# Altium integrated library Cap-Cer-SMD_V2.IntLib: 957 symbols (part 4 of 7) (continued)
## 22pF_0805N_50V_5%_C0G/NP0-DNF
designator C?, comment value (22pF)  Voltage: 50V  Text1: 0805  (hidden comment: 22pF_C0805_50V_5%_C0G/NP0)
Cap Ceramic C0G/NP0 - Do not Fit; Manufacturer: Various; Part Number: DNF - 22pF 0805 50V 5% C0G/NP0; Tol: 5%; Package: CAPC0805X110N; EDM-PN: *; Text2: *; SAAB PN: *; DCE Part No: *
footprint CAPC0805X110N (Chip Capacitor, 0805, 2-Leads, Body 2.0x1.3mm, IPC Medium Density)
pins: 1, 2

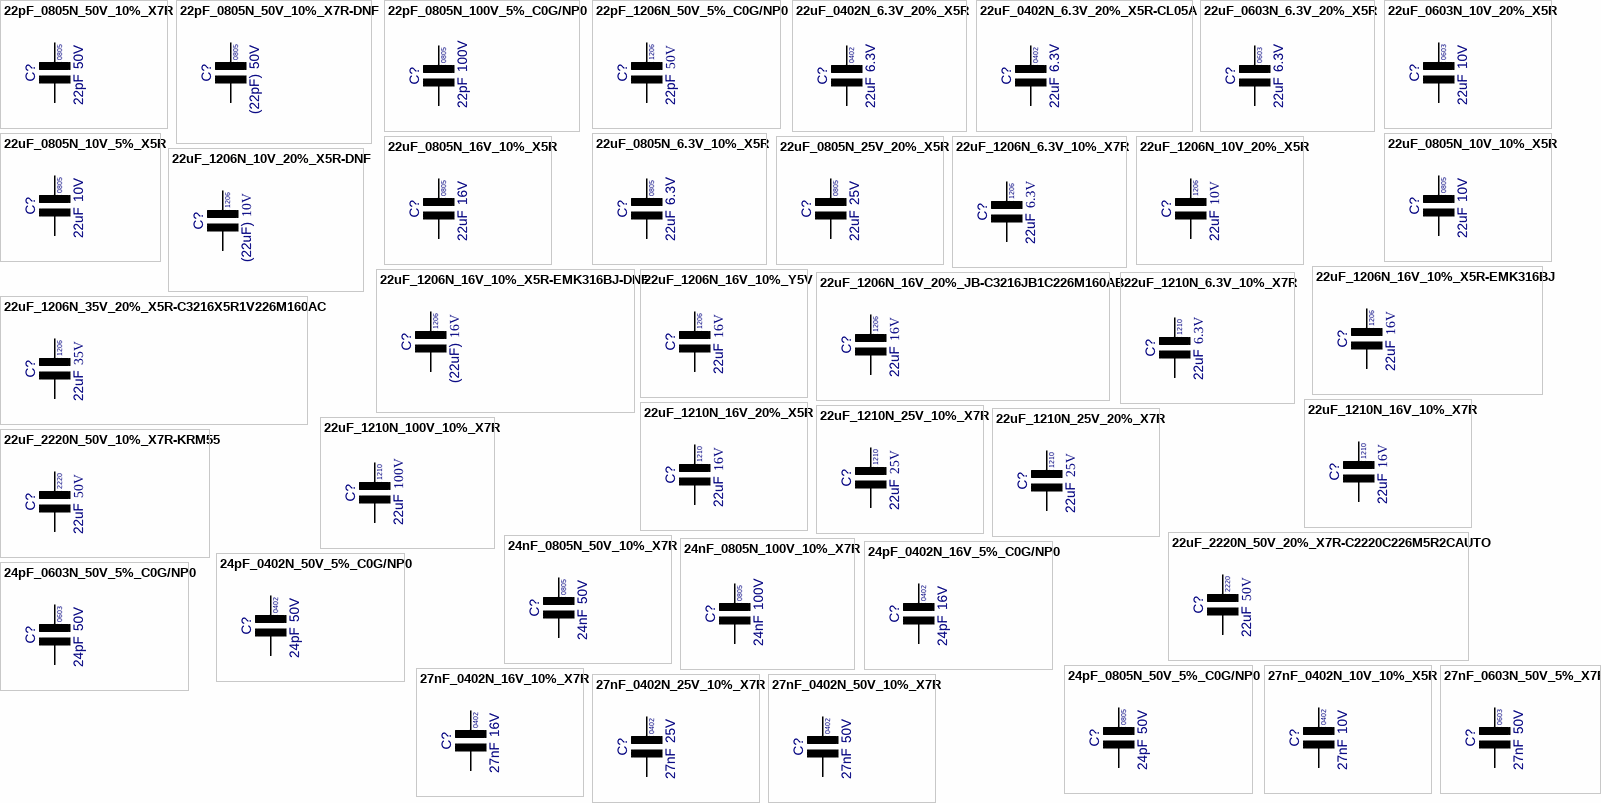
[diagram p13: symbols 22pF_0805N_50V_10%_X7R to 27nF_0603N_50V_5%_X7R]

## 22pF_0805N_50V_10%_X7R
designator C?, comment value 22pF  Voltage: 50V  Text1: 0805  (hidden comment: 22pF_C0805_50V_10%_X7R)
Cap Ceramic X7R; Manufacturer: Various; Part Number: 22pF 0805 50V 10% X7R; EDM-PN: CAP406; Tol: 10%; Package: CAPC0805X110N; Text2: *; SAAB PN: *; DCE Part No: *
footprint CAPC0805X110N (Chip Capacitor, 0805, 2-Leads, Body 2.0x1.3mm, IPC Medium Density)
pins: 1, 2

## 22pF_0805N_50V_10%_X7R-DNF
designator C?, comment value (22pF)  Voltage: 50V  Text1: 0805  (hidden comment: 22pF_C0805_50V_10%_X7R-DNF)
Cap Ceramic X7R - Do not Fit; Manufacturer: Various; Part Number: DNF - 22pF 0805 50V 10% X7R; EDM-PN: CAP406; Tol: 10%; Package: CAPC0805X110N; Text2: *; SAAB PN: *; DCE Part No: *
footprint CAPC0805X110N (Chip Capacitor, 0805, 2-Leads, Body 2.0x1.3mm, IPC Medium Density)
pins: 1, 2

## 22pF_0805N_100V_5%_C0G/NP0
designator C?, comment value 22pF  Voltage: 100V  Text1: 0805  (hidden comment: 22pF_C0805_100V_5%_C0G/NP0)
Cap Ceramic C0G/NP0; Manufacturer: Various; Part Number: 22pF 0805 100V 5% C0G/NP0; Tol: 5%; Package: CAPC0805X110N; EDM-PN: *; Text2: *; SAAB PN: *; DCE Part No: *
footprint CAPC0805X110N (Chip Capacitor, 0805, 2-Leads, Body 2.0x1.3mm, IPC Medium Density)
pins: 1, 2

## 22pF_1206N_50V_5%_C0G/NP0
designator C?, comment value 22pF  Voltage: 50V  Text1: 1206  (hidden comment: 22pF_C1206_50V_5%_C0G/NP0)
Cap Ceramic C0G/NP0; Manufacturer: Various; Part Number: 22pF 1206 50V 5% C0G/NP0; Tol: 5%; Package: CAPC1206X135N; EDM-PN: *; Text2: *; SAAB PN: *; DCE Part No: *
footprint CAPC1206X135N (Chip Capacitor, 1206, 2-Leads, Body 3.2x1.6mm, IPC Medium Density)
pins: 1, 2

## 22uF_0402N_6.3V_20%_X5R
designator C?, comment value 22uF  Voltage: 6.3V  Text1: 0402  (hidden comment: 224F_C0402_6.3V_20%_X5R)
Cap Ceramic X5R; Manufacturer: Various; Part Number: 22uF 0402 6.3V 20% X5R; EDM-PN: CAP948; Tol: 20%; Package: CAPC0402X60N; Text2: *; SAAB PN: *; DCE Part No: *
footprint CAPC0402X60N (Chip Capacitor, 0402, 2-Leads, Body 1.0x0.5mm, IPC Medium Density)
pins: 1, 2

## 22uF_0402N_6.3V_20%_X5R-CL05A
designator C?, comment value 22uF  Voltage: 6.3V  Text1: 0402  (hidden comment: 224F_C0402_6.3V_20%_X5R)
Cap Ceramic X5R; Manufacturer: Samsung; Part Number: CL05A226MQ5QUNC; Tol: 20%; Package: CAPC0402X60N; EDM-PN: *; Text2: *; SAAB PN: *; DCE Part No: *
footprint CAPC0402X60N (Chip Capacitor, 0402, 2-Leads, Body 1.0x0.5mm, IPC Medium Density)
pins: 1, 2

## 22uF_0603N_6.3V_20%_X5R
designator C?, comment value 22uF  Voltage: 6.3V  Text1: 0603  (hidden comment: 22uF_C0603_6.3V_20%_X5R)
Cap Ceramic X5R; Manufacturer: Various; Part Number: 22uF 0603 6.3V 20% X5R; DCE Part No: 9645; Tol: 20%; Package: CAPC0603X85N; EDM-PN: *; Text2: *; SAAB PN: *
footprint CAPC0603X85N (Chip Capacitor, 0603, 2-Leads, Body 1.6x0.8mm, IPC Medium Density)
pins: 1, 2

## 22uF_0603N_10V_20%_X5R
designator C?, comment value 22uF  Voltage: 10V  Text1: 0603  (hidden comment: 22uF_C0603_10V_20%_X5R)
Cap Ceramic X5R; Manufacturer: Various; Part Number: 22uF 0603 10V 20% X5R; EDM-PN: CAP933; Tol: 20%; Package: CAPC0603X85N; Text2: *; SAAB PN: *; DCE Part No: *
footprint CAPC0603X85N (Chip Capacitor, 0603, 2-Leads, Body 1.6x0.8mm, IPC Medium Density)
pins: 1, 2

## 22uF_0805N_6.3V_10%_X5R
designator C?, comment value 22uF  Voltage: 6.3V  Text1: 0805  (hidden comment: 22uF_C0805_6.3V_10%_X5R)
Cap Ceramic X5R; Manufacturer: Various; Part Number: 22uF 0805 6.3V 10% X5R; EDM-PN: CAP455; Tol: 10%; Package: CAPC0805X110N; Text2: *; SAAB PN: *; DCE Part No: *
footprint CAPC0805X110N (Chip Capacitor, 0805, 2-Leads, Body 2.0x1.3mm, IPC Medium Density)
pins: 1, 2

## 22uF_0805N_10V_5%_X5R
designator C?, comment value 22uF  Voltage: 10V  Text1: 0805  (hidden comment: 22uF_C0805_10V_5%_X5R)
Cap Ceramic X5R; Manufacturer: Various; Part Number: 22uF 0805 10V 5% X5R; EDM-PN: CAP455; Tol: 5%; Package: CAPC0805X110N; Text2: *; SAAB PN: *; DCE Part No: *
footprint CAPC0805X110N (Chip Capacitor, 0805, 2-Leads, Body 2.0x1.3mm, IPC Medium Density)
pins: 1, 2

## 22uF_0805N_10V_10%_X5R
designator C?, comment value 22uF  Voltage: 10V  Text1: 0805  (hidden comment: 22uF_C0805_10V_10%_X5R)
Cap Ceramic X5R; Manufacturer: Various; Part Number: 22uF 0805 10V 10% X5R; Tol: 10%; Package: CAPC0805X110N; EDM-PN: *; Text2: *; SAAB PN: *; DCE Part No: *
footprint CAPC0805X110N (Chip Capacitor, 0805, 2-Leads, Body 2.0x1.3mm, IPC Medium Density)
pins: 1, 2

## 22uF_0805N_16V_10%_X5R
designator C?, comment value 22uF  Voltage: 16V  Text1: 0805  (hidden comment: 22uF_C0805_16V_10%_X5R)
Cap Ceramic X5R; Manufacturer: Various; Part Number: 22uF 0805 16V 10% X5R; Tol: 10%; Package: CAPC0805X110N; EDM-PN: *; Text2: *; SAAB PN: *; DCE Part No: *
footprint CAPC0805X110N (Chip Capacitor, 0805, 2-Leads, Body 2.0x1.3mm, IPC Medium Density)
pins: 1, 2

## 22uF_0805N_25V_20%_X5R
designator C?, comment value 22uF  Voltage: 25V  Text1: 0805  (hidden comment: 22uF_C0805_25V_20%_X5R)
Cap Ceramic X5R; Manufacturer: Various; Part Number: 22uF 0805 25V 20% X5R; Tol: 20%; Package: CAPC0805X110N; EDM-PN: *; Text2: *; SAAB PN: *; DCE Part No: *
footprint CAPC0805X110N (Chip Capacitor, 0805, 2-Leads, Body 2.0x1.3mm, IPC Medium Density)
pins: 1, 2

## 22uF_1206N_6.3V_10%_X7R
designator C?, comment value 22uF  Voltage: 6.3V  Text1: 1206  (hidden comment: 22uF_C1206_6.3V_10%_X7R)
Cap Ceramic X7R; Manufacturer: Various; Part Number: 22uF 1206 6.3V 10% X7R; Tol: 10%; Package: CAPC1206X135N; EDM-PN: *; Text2: *; SAAB PN: *; DCE Part No: *
footprint CAPC1206X135N (Chip Capacitor, 1206, 2-Leads, Body 3.2x1.6mm, IPC Medium Density)
pins: 1, 2

## 22uF_1206N_10V_20%_X5R
designator C?, comment value 22uF  Voltage: 10V  Text1: 1206  (hidden comment: 22uF_C1206_10V_20%_X5R)
Cap Ceramic X5R; Manufacturer: Various; Part Number: 22uF 1206 10V 20% X5R; EDM-PN: CAP424; Tol: 20%; Package: CAPC1206X135N; Text2: *; SAAB PN: *; DCE Part No: *
footprint CAPC1206X135N (Chip Capacitor, 1206, 2-Leads, Body 3.2x1.6mm, IPC Medium Density)
pins: 1, 2

## 22uF_1206N_10V_20%_X5R-DNF
designator C?, comment value (22uF)  Voltage: 10V  Text1: 1206  (hidden comment: 22uF_C1206_10V_20%_X5R)
Cap Ceramic X5R - Do not Fit; Manufacturer: Various; Part Number: DNF - 22uF 1206 10V 20% X5R; EDM-PN: CAP424; Tol: 20%; Package: CAPC1206X135N; Text2: *; SAAB PN: *; DCE Part No: *
footprint CAPC1206X135N (Chip Capacitor, 1206, 2-Leads, Body 3.2x1.6mm, IPC Medium Density)
pins: 1, 2

## 22uF_1206N_16V_10%_X5R-EMK316BJ
designator C?, comment value 22uF  Voltage: 16V  Text1: 1206  (hidden comment: 22uF_C1206_16V_10%_X5R)
Cap Ceramic X5R; Manufacturer: Taiyo Yuden; Part Number: EMK316BJ226KL; EDM-PN: CAP735; Tol: 10%; Package: CAPC1206X135N; Text2: *; SAAB PN: *; DCE Part No: *
footprint CAPC1206X178N (Chip Capacitor, 1206, 2-Leads, Body 3.2x1.6mm, IPC Medium Density)
pins: 1, 2

## 22uF_1206N_16V_10%_X5R-EMK316BJ-DNF
designator C?, comment value (22uF)  Voltage: 16V  Text1: 1206  (hidden comment: 22uF_C1206_16V_10%_X5R-DNF)
Cap Ceramic X5R - Do not Fit; Manufacturer: Taiyo Yuden; Part Number: DNF-EMK316BJ226KL; EDM-PN: NA; Tol: 10%; Package: CAPC1206X135N; Text2: *; SAAB PN: *; DCE Part No: *
footprint CAPC1206X178N (Chip Capacitor, 1206, 2-Leads, Body 3.2x1.6mm, IPC Medium Density)
pins: 1, 2

## 22uF_1206N_16V_10%_Y5V
designator C?, comment value 22uF  Voltage: 16V  Text1: 1206  (hidden comment: 22uF_C1206_16V_10%_Y5V)
Cap Ceramic Y5V; Manufacturer: Various; Part Number: 22uF 1206 16V 10% Y5V; Tol: 10%; Package: CAPC1206X135N; EDM-PN: *; Text2: *; SAAB PN: *; DCE Part No: *
footprint CAPC1206X135N (Chip Capacitor, 1206, 2-Leads, Body 3.2x1.6mm, IPC Medium Density)
pins: 1, 2

## 22uF_1206N_16V_20%_JB-C3216JB1C226M160AB
designator C?, comment value 22uF  Voltage: 16V  Text1: 1206  (hidden comment: C3216JB1C226M160AB)
Cap Ceramic JB - Low ESL; Manufacturer: TDK; Tol: 20%; Part Number: C3216JB1C226M160AB; Package: CAPC1206X135N; EDM-PN: *; Text2: *; SAAB PN: *; DCE Part No: *
footprint CAPC1206X178N (Chip Capacitor, 1206, 2-Leads, Body 3.2x1.6mm, IPC Medium Density)
pins: 1, 2

## 22uF_1206N_35V_20%_X5R-C3216X5R1V226M160AC
designator C?, comment value 22uF  Voltage: 35V  Text1: 1206  (hidden comment: C3216X5R1V226M160AC)
Cap Ceramic X5R; Manufacturer: TDK; Tol: 20%; Part Number: C3216X5R1V226M160AC; Package: CAPC1206X135N; EDM-PN: *; Text2: *; SAAB PN: *; DCE Part No: *
footprint CAPC1206X178N (Chip Capacitor, 1206, 2-Leads, Body 3.2x1.6mm, IPC Medium Density)
pins: 1, 2

## 22uF_1210N_6.3V_10%_X7R
designator C?, comment value 22uF  Voltage: 6.3V  Text1: 1210  (hidden comment: 22uF_C1210_6.3V_10%_X7R)
Cap Ceramic X5R; Manufacturer: Various; Part Number: 22uF 1210 6.3V 10% X7R; Tol: 10%; Package: CAPC1210X135N; EDM-PN: *; Text2: *; SAAB PN: *; DCE Part No: *
footprint CAPC1210X135N (Chip Capacitor, 1210, 2-Leads, Body 3.2x2.5mm, IPC Medium Density)
pins: 1, 2

## 22uF_1210N_16V_10%_X7R
designator C?, comment value 22uF  Voltage: 16V  Text1: 1210  (hidden comment: 22uF_C1210_16V_10%_X7R)
Cap Ceramic X7R; Manufacturer: Various; Part Number: 22uF 1210 16V 10% X7R; Tol: 10%; Package: CAPC1210X135N; EDM-PN: *; Text2: *; SAAB PN: *; DCE Part No: *
footprint CAPC1210X135N (Chip Capacitor, 1210, 2-Leads, Body 3.2x2.5mm, IPC Medium Density)
pins: 1, 2

## 22uF_1210N_16V_20%_X5R
designator C?, comment value 22uF  Voltage: 16V  Text1: 1210  (hidden comment: 22uF_C1210_16V_20%_X5R)
Cap Ceramic X5R; Manufacturer: Various; Part Number: 22uF 1210 16V 20% X5R; Tol: 20%; Package: CAPC1210X135N; EDM-PN: *; Text2: *; SAAB PN: *; DCE Part No: *
footprint CAPC1210X135N (Chip Capacitor, 1210, 2-Leads, Body 3.2x2.5mm, IPC Medium Density)
pins: 1, 2

## 22uF_1210N_25V_10%_X7R
designator C?, comment value 22uF  Voltage: 25V  Text1: 1210  (hidden comment: 22uF_C1210_25V_10%_X7R)
Cap Ceramic X7R; Manufacturer: Various; Part Number: 22uF 1210 25V 10% X7R; EDM-PN: CAP995; Tol: 10%; SAAB PN: 1AAB00437AEA; Package: CAPC1210X135N; Text2: *; DCE Part No: *
footprint CAPC1210X135N (Chip Capacitor, 1210, 2-Leads, Body 3.2x2.5mm, IPC Medium Density)
pins: 1, 2

## 22uF_1210N_25V_20%_X7R
designator C?, comment value 22uF  Voltage: 25V  Text1: 1210  (hidden comment: 22uF_C1210_25V_20%_X7R)
Cap Ceramic X7R; Manufacturer: Various; Part Number: 22uF 1210 25V 20% X7R; EDM-PN: CAP871; Tol: 20%; Reutech PN: 5910-CA-0490; SAAB PN: 1AAB00485AEA; Package: CAPC1210X135N; Text2: *; DCE Part No: *
footprint CAPC1210X135N (Chip Capacitor, 1210, 2-Leads, Body 3.2x2.5mm, IPC Medium Density)
pins: 1, 2

## 22uF_1210N_100V_10%_X7R
designator C?, comment value 22uF  Voltage: 100V  Text1: 1210  (hidden comment: 22uF_C1210_100V_10%_X7R)
Cap Ceramic X7R; Manufacturer: Various; Part Number: 22uF 1210 100V 10% X7R; Tol: 10%; Package: CAPC1210X135N; EDM-PN: *; Text2: *; SAAB PN: *; DCE Part No: *
footprint CAPC1210X135N (Chip Capacitor, 1210, 2-Leads, Body 3.2x2.5mm, IPC Medium Density)
pins: 1, 2

## 22uF_2220N_50V_10%_X7R-KRM55
designator C?, comment value 22uF  Voltage: 50V  Text1: 2220  (hidden comment: 22uF_C2220_50V_10%_X7R)
Cap Ceramic X7R Stacked; Manufacturer: Murata; Part Number: KRM55TR71H226MH01L; Tol: 10%; Reutech PN: 5910-CA-0553; Package: CAPC2220-2Chip-5.5; EDM-PN: *; Text2: *; SAAB PN: *; DCE Part No: *
footprint CAPC2220-2Chip-5.5 (Chip Capacitor, 2220, 2-Chips, 6.1x5.3mm)
pins: 1, 2

## 22uF_2220N_50V_20%_X7R-C2220C226M5R2CAUTO
designator C?, comment value 22uF  Voltage: 50V  Text1: 2220  (hidden comment: C2220C226M5R2CAUTO)
Cap Ceramic X7R Stacked AEC-Q200; Manufacturer: Kemet; Tol: 20%; Reutech PN: 5910-CE-0158; Part Number: C2220C226M5R2CAUTO; Package: CAPC2220-2Chip-5.5; EDM-PN: *; Text2: *; SAAB PN: *; DCE Part No: *
footprint CAPC2220-2Chip-5.5 (Chip Capacitor, 2220, 2-Chips, 6.1x5.3mm)
pins: 1, 2

## 24nF_0805N_50V_10%_X7R
designator C?, comment value 24nF  Voltage: 50V  Text1: 0805  (hidden comment: 24nF_C0805_50V_10%_X7R)
Cap Ceramic X7R; Manufacturer: Various; Part Number: 24nF 0805 50V 10% X7R; Tol: 10%; Package: CAPC0805X110N; EDM-PN: *; Text2: *; SAAB PN: *; DCE Part No: *
footprint CAPC0805X110N (Chip Capacitor, 0805, 2-Leads, Body 2.0x1.3mm, IPC Medium Density)
pins: 1, 2

## 24nF_0805N_100V_10%_X7R
designator C?, comment value 24nF  Voltage: 100V  Text1: 0805  (hidden comment: 24nF_C0805_100V_10%_X7R)
Cap Ceramic X7R; Manufacturer: Various; Part Number: 24nF 0805 100V 10% X7R; Tol: 10%; Package: CAPC0805X110N; EDM-PN: *; Text2: *; SAAB PN: *; DCE Part No: *
footprint CAPC0805X110N (Chip Capacitor, 0805, 2-Leads, Body 2.0x1.3mm, IPC Medium Density)
pins: 1, 2

## 24pF_0402N_16V_5%_C0G/NP0
designator C?, comment value 24pF  Voltage: 16V  Text1: 0402  (hidden comment: 24pF_C0402_16V_5%_C0G/NP0)
Cap Ceramic C0G/NP0; Manufacturer: Various; Part Number: 24pF 0402 16V 5% C0G/NP0; Tol: 5%; Package: CAPC0402X60N; EDM-PN: *; Text2: *; SAAB PN: *; DCE Part No: *
footprint CAPC0402X60N (Chip Capacitor, 0402, 2-Leads, Body 1.0x0.5mm, IPC Medium Density)
pins: 1, 2

## 24pF_0402N_50V_5%_C0G/NP0
designator C?, comment value 24pF  Voltage: 50V  Text1: 0402  (hidden comment: 24pF_C0402_50V_5%_C0G/NP0)
Cap Ceramic C0G/NP0; Manufacturer: Various; Part Number: 24pF 0402 50V 5% C0G/NP0; Tol: 5%; Package: CAPC0402X60N; EDM-PN: *; Text2: *; SAAB PN: *; DCE Part No: *
footprint CAPC0402X60N (Chip Capacitor, 0402, 2-Leads, Body 1.0x0.5mm, IPC Medium Density)
pins: 1, 2

## 24pF_0603N_50V_5%_C0G/NP0
designator C?, comment value 24pF  Voltage: 50V  Text1: 0603  (hidden comment: 24pF_C0603_50V_5%_C0G/NP0)
Cap Ceramic C0G/NP0; Manufacturer: Various; Part Number: 24pF 0603 50V 5% C0G/NP0; Tol: 5%; Package: CAPC0603X85N; EDM-PN: *; Text2: *; SAAB PN: *; DCE Part No: *
footprint CAPC0603X85N (Chip Capacitor, 0603, 2-Leads, Body 1.6x0.8mm, IPC Medium Density)
pins: 1, 2

## 24pF_0805N_50V_5%_C0G/NP0
designator C?, comment value 24pF  Voltage: 50V  Text1: 0805  (hidden comment: 24pF_C0805_50V_5%_C0G/NP0)
Cap Ceramic C0G/NP0; Manufacturer: Various; Part Number: 24pF 0805 50V 5% C0G/NP0; Tol: 5%; Package: CAPC0805X110N; EDM-PN: *; Text2: *; SAAB PN: *; DCE Part No: *
footprint CAPC0805X110N (Chip Capacitor, 0805, 2-Leads, Body 2.0x1.3mm, IPC Medium Density)
pins: 1, 2

## 27nF_0402N_10V_10%_X5R
designator C?, comment value 27nF  Voltage: 10V  Text1: 0402  (hidden comment: 27nF_C0402_10V_10%_X5R)
Cap Ceramic X5R; Manufacturer: Various; Part Number: 27nF 0402 10V 10% X5R; Tol: 10%; Reutech PN: 5910-CA-0460; Package: CAPC0402X60N; EDM-PN: *; Text2: *; SAAB PN: *; DCE Part No: *
footprint CAPC0402X60N (Chip Capacitor, 0402, 2-Leads, Body 1.0x0.5mm, IPC Medium Density)
pins: 1, 2

## 27nF_0402N_16V_10%_X7R
designator C?, comment value 27nF  Voltage: 16V  Text1: 0402  (hidden comment: 27nF_C0402_16V_10%_X7R)
Cap Ceramic X7R; Manufacturer: Various; Part Number: 27nF 0402 16V 10% X7R; Tol: 10%; Package: CAPC0402X60N; EDM-PN: *; Text2: *; SAAB PN: *; DCE Part No: *
footprint CAPC0402X60N (Chip Capacitor, 0402, 2-Leads, Body 1.0x0.5mm, IPC Medium Density)
pins: 1, 2

## 27nF_0402N_25V_10%_X7R
designator C?, comment value 27nF  Voltage: 25V  Text1: 0402  (hidden comment: 27nF_C0402_25V_10%_X7R)
Cap Ceramic X7R; Manufacturer: Various; Part Number: 27nF 0402 25V 10% X7R; Tol: 10%; Package: CAPC0402X60N; EDM-PN: *; Text2: *; SAAB PN: *; DCE Part No: *
footprint CAPC0402X60N (Chip Capacitor, 0402, 2-Leads, Body 1.0x0.5mm, IPC Medium Density)
pins: 1, 2

## 27nF_0402N_50V_10%_X7R
designator C?, comment value 27nF  Voltage: 50V  Text1: 0402  (hidden comment: 27nF_C0402_50V_10%_X7R)
Cap Ceramic X7R; Manufacturer: Various; Part Number: 27nF 0402 50V 10% X7R; Tol: 10%; Package: CAPC0402X60N; EDM-PN: *; Text2: *; SAAB PN: *; DCE Part No: *
footprint CAPC0402X60N (Chip Capacitor, 0402, 2-Leads, Body 1.0x0.5mm, IPC Medium Density)
pins: 1, 2

## 27nF_0603N_50V_5%_X7R
designator C?, comment value 27nF  Voltage: 50V  Text1: 0603  (hidden comment: 27nF_C0603_50V_5%_X7R)
Cap Ceramic X7R; Manufacturer: Various; Part Number: 27nF 0603 50V 5% X7R; EDM-PN: CAP654; Tol: 5%; Package: CAPC0603X85N; Text2: *; SAAB PN: *; DCE Part No: *
footprint CAPC0603X85N (Chip Capacitor, 0603, 2-Leads, Body 1.6x0.8mm, IPC Medium Density)
pins: 1, 2

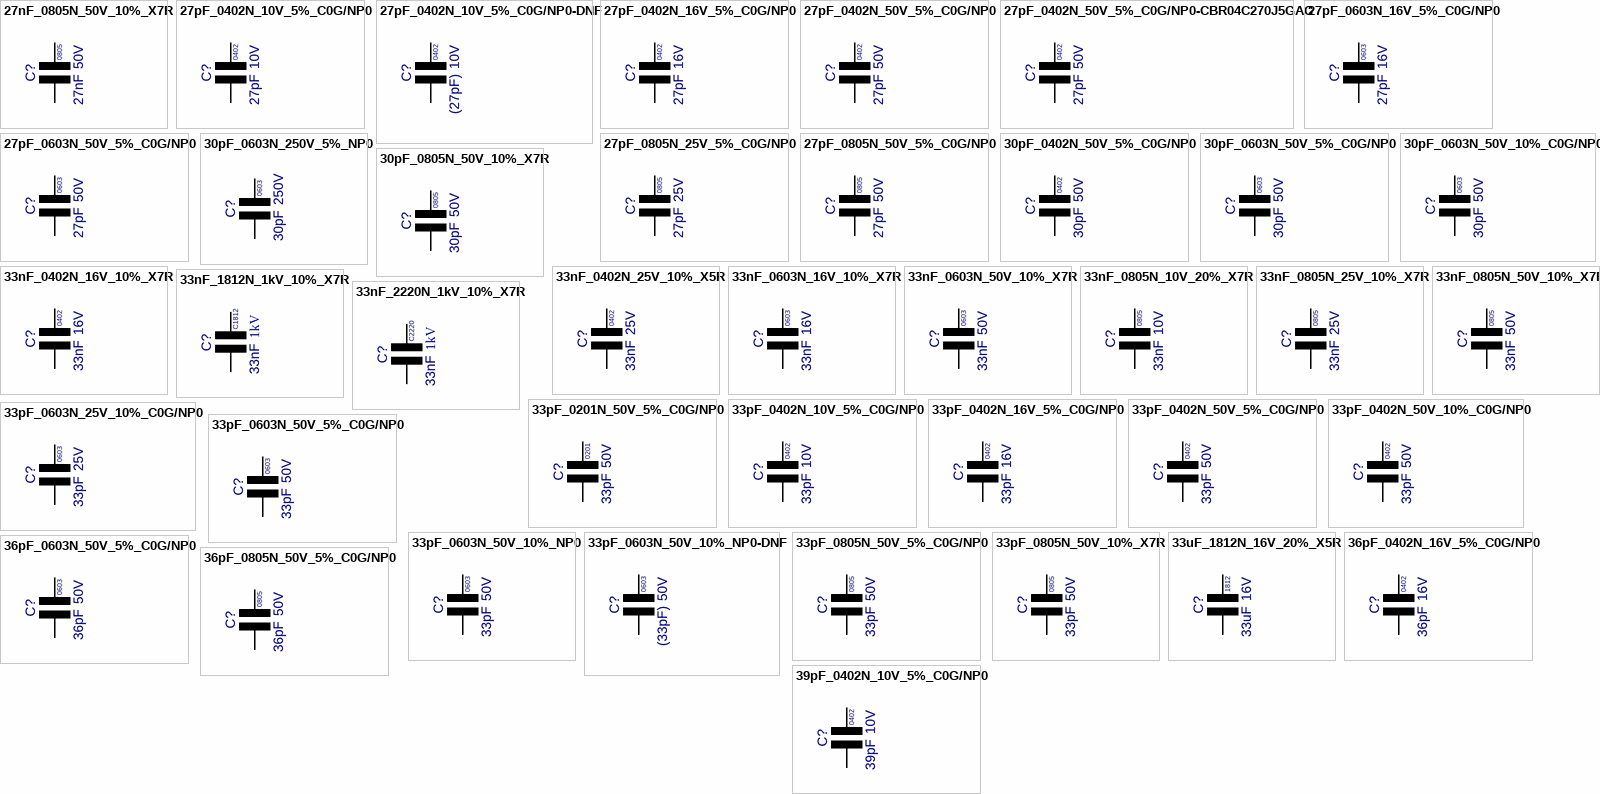
[diagram p14: symbols 27nF_0805N_50V_10%_X7R to 39pF_0402N_10V_5%_C0G/NP0]

## 27nF_0805N_50V_10%_X7R
designator C?, comment value 27nF  Voltage: 50V  Text1: 0805  (hidden comment: 27nF_C0805_50V_10%_X7R)
Cap Ceramic X7R; Manufacturer: Various; Part Number: 27nF 0805 50V 10% X7R; Tol: 10%; Package: CAPC0805X110N; EDM-PN: *; Text2: *; SAAB PN: *; DCE Part No: *
footprint CAPC0805X110N (Chip Capacitor, 0805, 2-Leads, Body 2.0x1.3mm, IPC Medium Density)
pins: 1, 2

## 27pF_0402N_10V_5%_C0G/NP0
designator C?, comment value 27pF  Voltage: 10V  Text1: 0402  (hidden comment: 27pF_C0402_10V_5%_C0G/NP0)
Cap Ceramic C0G/NP0; Manufacturer: Various; Part Number: 27pF 0402 10V 5% C0G/NP0; Tol: 5%; Package: CAPC0402X60N; EDM-PN: *; Text2: *; SAAB PN: *; DCE Part No: *
footprint CAPC0402X60N (Chip Capacitor, 0402, 2-Leads, Body 1.0x0.5mm, IPC Medium Density)
pins: 1, 2

## 27pF_0402N_10V_5%_C0G/NP0-DNF
designator C?, comment value (27pF)  Voltage: 10V  Text1: 0402  (hidden comment: 27pF_C0402_10V_5%_C0G/NP0-DNF)
Cap Ceramic C0G/NP0 - Do not Fit; Manufacturer: Various; Part Number: DNF - 27pF 0402 10V 5% C0G/NP0; Tol: 5%; Package: CAPC0402X60N; EDM-PN: *; Text2: *; SAAB PN: *; DCE Part No: *
footprint CAPC0402X60N (Chip Capacitor, 0402, 2-Leads, Body 1.0x0.5mm, IPC Medium Density)
pins: 1, 2

## 27pF_0402N_16V_5%_C0G/NP0
designator C?, comment value 27pF  Voltage: 16V  Text1: 0402  (hidden comment: 27pF_C0402_16V_5%_C0G/NP0)
Cap Ceramic C0G/NP0; Manufacturer: Various; Part Number: 27pF 0402 16V 5% C0G/NP0; EDM-PN: CAP325; Tol: 5%; Package: CAPC0402X60N; Text2: *; SAAB PN: *; DCE Part No: *
footprint CAPC0402X60N (Chip Capacitor, 0402, 2-Leads, Body 1.0x0.5mm, IPC Medium Density)
pins: 1, 2

## 27pF_0402N_50V_5%_C0G/NP0
designator C?, comment value 27pF  Voltage: 50V  Text1: 0402  (hidden comment: 27pF_C0402_50V_5%_C0G/NP0)
Cap Ceramic C0G/NP0; Manufacturer: Various; Part Number: 27pF 0402 50V 5% C0G/NP0; EDM-PN: CAP325; Tol: 5%; Reutech PN: 5910-CA-0569; Package: CAPC0402X60N; Text2: *; SAAB PN: *; DCE Part No: *
footprint CAPC0402X60N (Chip Capacitor, 0402, 2-Leads, Body 1.0x0.5mm, IPC Medium Density)
pins: 1, 2

## 27pF_0402N_50V_5%_C0G/NP0-CBR04C270J5GAC
designator C?, comment value 27pF  Voltage: 50V  Text1: 0402  (hidden comment: CBR04C270J5GAC)
Cap Ceramic C0G/NP0 HiQ-CBR Series for RF; Manufacturer: Kemet; EDM-PN: CAP1409; Tol: 5%; Part Number: CBR04C270J5GAC; Package: CAPC0402X60N; Text2: *; SAAB PN: *; DCE Part No: *
footprint CAPC0402X60N (Chip Capacitor, 0402, 2-Leads, Body 1.0x0.5mm, IPC Medium Density)
pins: 1, 2

## 27pF_0603N_16V_5%_C0G/NP0
designator C?, comment value 27pF  Voltage: 16V  Text1: 0603  (hidden comment: 27pF_C0603_16V_5%_C0G/NP0)
Cap Ceramic C0G/NP0; Manufacturer: Various; Part Number: 27pF 0603 16V 5% C0G/NP0; Tol: 5%; Package: CAPC0603X85N; EDM-PN: *; Text2: *; SAAB PN: *; DCE Part No: *
footprint CAPC0603X85N (Chip Capacitor, 0603, 2-Leads, Body 1.6x0.8mm, IPC Medium Density)
pins: 1, 2

## 27pF_0603N_50V_5%_C0G/NP0
designator C?, comment value 27pF  Voltage: 50V  Text1: 0603  (hidden comment: 27pF_C0603_50V_5%_C0G/NP0)
Cap Ceramic C0G/NP0; Manufacturer: Various; Part Number: 27pF 0603 50V 5% C0G/NP0; Tol: 5%; Reutech PN: 5910-CA-0463; Package: CAPC0603X85N; EDM-PN: *; Text2: *; SAAB PN: *; DCE Part No: *
footprint CAPC0603X85N (Chip Capacitor, 0603, 2-Leads, Body 1.6x0.8mm, IPC Medium Density)
pins: 1, 2

## 27pF_0805N_25V_5%_C0G/NP0
designator C?, comment value 27pF  Voltage: 25V  Text1: 0805  (hidden comment: 27pF_C0805_25V_5%_C0G/NP0)
Cap Ceramic C0G/NP0; Manufacturer: Various; Part Number: 27pF 0805 25V 5% C0G/NP0; EDM-PN: CAP264; Tol: 5%; Package: CAPC0805X110N; Text2: *; SAAB PN: *; DCE Part No: *
footprint CAPC0805X110N (Chip Capacitor, 0805, 2-Leads, Body 2.0x1.3mm, IPC Medium Density)
pins: 1, 2

## 27pF_0805N_50V_5%_C0G/NP0
designator C?, comment value 27pF  Voltage: 50V  Text1: 0805  (hidden comment: 27pF_C0805_50V_5%_C0G/NP0)
Cap Ceramic C0G/NP0; Manufacturer: Various; Part Number: 27pF 0805 50V 5% C0G/NP0; Tol: 5%; Package: CAPC0805X110N; EDM-PN: *; Text2: *; SAAB PN: *; DCE Part No: *
footprint CAPC0805X110N (Chip Capacitor, 0805, 2-Leads, Body 2.0x1.3mm, IPC Medium Density)
pins: 1, 2

## 30pF_0402N_50V_5%_C0G/NP0
designator C?, comment value 30pF  Voltage: 50V  Text1: 0402  (hidden comment: 30pF_C0402_50V_5%_C0G/NP0)
Cap Ceramic C0G/NP0; Manufacturer: Various; Part Number: 30pF 0402 50V 5% C0G/NP0; Tol: 5%; Package: CAPC0402X60N; EDM-PN: *; Text2: *; Reutech PN: *; SAAB PN: *; DCE Part No: *
footprint CAPC0402X60N (Chip Capacitor, 0402, 2-Leads, Body 1.0x0.5mm, IPC Medium Density)
pins: 1, 2

## 30pF_0603N_50V_5%_C0G/NP0
designator C?, comment value 30pF  Voltage: 50V  Text1: 0603  (hidden comment: 30pF_C0603_50V_5%_C0G/NP0)
Cap Ceramic C0G/NP0; Manufacturer: Various; Part Number: 30pF 0603 50V 5% C0G/NP0; Tol: 5%; Package: CAPC0603X85N; EDM-PN: *; Text2: *; Reutech PN: *; SAAB PN: *; DCE Part No: *
footprint CAPC0603X85N (Chip Capacitor, 0603, 2-Leads, Body 1.6x0.8mm, IPC Medium Density)
pins: 1, 2

## 30pF_0603N_50V_10%_C0G/NP0
designator C?, comment value 30pF  Voltage: 50V  Text1: 0603  (hidden comment: 330pF_C0603_50V_10%_C0G/NP0)
Cap Ceramic C0G/NP0; Manufacturer: Various; Part Number: 30pF 0603 50V 10% C0G/NP0; Tol: 10%; Package: CAPC0603X85N; EDM-PN: *; Text2: *; SAAB PN: *; DCE Part No: *
footprint CAPC0603X85N (Chip Capacitor, 0603, 2-Leads, Body 1.6x0.8mm, IPC Medium Density)
pins: 1, 2

## 30pF_0603N_250V_5%_NP0
designator C?, comment value 30pF  Voltage: 250V  Text1: 0603  (hidden comment: 330pF_C0603_250V_5%_NP0)
Cap Ceramic NP0; Manufacturer: Vishay; Part Number: VJ0603D300JXPAJ; Tol: 5%; Package: CAPC0603X85N; EDM-PN: *; Text2: *; SAAB PN: *; DCE Part No: *
footprint CAPC0603X85N (Chip Capacitor, 0603, 2-Leads, Body 1.6x0.8mm, IPC Medium Density)
pins: 1, 2

## 30pF_0805N_50V_10%_X7R
designator C?, comment value 30pF  Voltage: 50V  Text1: 0805  (hidden comment: 30pF_C0805_50V_10%_X7R)
Cap Ceramic X7R; Manufacturer: Various; Part Number: 30pF 0805 50V 10% X7R; EDM-PN: CAP1242; Tol: 10%; Package: CAPC0805X110N; Text2: *; SAAB PN: *; DCE Part No: *
footprint CAPC0805X110N (Chip Capacitor, 0805, 2-Leads, Body 2.0x1.3mm, IPC Medium Density)
pins: 1, 2

## 33nF_0402N_16V_10%_X7R
designator C?, comment value 33nF  Voltage: 16V  Text1: 0402  (hidden comment: 33nF_C0402_16V_10%_X7R)
Cap Ceramic X7R; Manufacturer: Various; Part Number: 33nF 0402 16V 10% X7R; EDM-PN: CAP595; Tol: 10%; Package: CAPC0402X60N; Text2: *; SAAB PN: *; DCE Part No: *
footprint CAPC0402X60N (Chip Capacitor, 0402, 2-Leads, Body 1.0x0.5mm, IPC Medium Density)
pins: 1, 2

## 33nF_0402N_25V_10%_X5R
designator C?, comment value 33nF  Voltage: 25V  Text1: 0402  (hidden comment: 33nF_C0402_25V_10%_X5R)
Cap Ceramic X5R; Manufacturer: Various; Part Number: 33nF 0402 25V 10% X5R; DCE Part No: 9571; Tol: 10%; Package: CAPC0402X60N; EDM-PN: *; Text2: *; SAAB PN: *
footprint CAPC0402X60N (Chip Capacitor, 0402, 2-Leads, Body 1.0x0.5mm, IPC Medium Density)
pins: 1, 2

## 33nF_0603N_16V_10%_X7R
designator C?, comment value 33nF  Voltage: 16V  Text1: 0603  (hidden comment: 33nF_C0603_16V_10%_X7R)
Cap Ceramic X7R; Manufacturer: Various; Part Number: 33nF 0603 16V 10% X7R; Tol: 10%; Package: CAPC0603X85N; EDM-PN: *; Text2: *; SAAB PN: *; DCE Part No: *
footprint CAPC0603X85N (Chip Capacitor, 0603, 2-Leads, Body 1.6x0.8mm, IPC Medium Density)
pins: 1, 2

## 33nF_0603N_50V_10%_X7R
designator C?, comment value 33nF  Voltage: 50V  Text1: 0603  (hidden comment: 33nF_C0603_50V_10%_X7R)
Cap Ceramic X7R; Manufacturer: Various; Part Number: 33nF 0603 50V 10% X7R; EDM-PN: CAP729; Tol: 10%; Reutech PN: 5910-CA-0476; Package: CAPC0603X85N; Text2: *; SAAB PN: *; DCE Part No: *
footprint CAPC0603X85N (Chip Capacitor, 0603, 2-Leads, Body 1.6x0.8mm, IPC Medium Density)
pins: 1, 2

## 33nF_0805N_10V_20%_X7R
designator C?, comment value 33nF  Voltage: 10V  Text1: 0805  (hidden comment: 33nF_C0805_10V_20%_X7R)
Cap Ceramic X7R; Manufacturer: Various; Part Number: 33nF 0805 10V 20% X7R; EDM-PN: CAP30; Tol: 20%; Package: CAPC0805X110N; Text2: *; SAAB PN: *; DCE Part No: *
footprint CAPC0805X110N (Chip Capacitor, 0805, 2-Leads, Body 2.0x1.3mm, IPC Medium Density)
pins: 1, 2

## 33nF_0805N_25V_10%_X7R
designator C?, comment value 33nF  Voltage: 25V  Text1: 0805  (hidden comment: 33nF_C0805_25V_10%_X7R)
Cap Ceramic X7R; Manufacturer: Various; Part Number: 33nF 0805 25V 10% X7R; EDM-PN: CAP30; Tol: 10%; Package: CAPC0805X110N; Text2: *; SAAB PN: *; DCE Part No: *
footprint CAPC0805X110N (Chip Capacitor, 0805, 2-Leads, Body 2.0x1.3mm, IPC Medium Density)
pins: 1, 2

## 33nF_0805N_50V_10%_X7R
designator C?, comment value 33nF  Voltage: 50V  Text1: 0805  (hidden comment: 33nF_C0805_50V_10%_X7R)
Cap Ceramic X7R; Manufacturer: Various; Part Number: 33nF 0805 50V 10% X7R; Tol: 10%; Package: CAPC0805X110N; EDM-PN: *; Text2: *; SAAB PN: *; DCE Part No: *
footprint CAPC0805X110N (Chip Capacitor, 0805, 2-Leads, Body 2.0x1.3mm, IPC Medium Density)
pins: 1, 2

## 33nF_1812N_1kV_10%_X7R
designator C?, comment value 33nF  Text1: C1812  Voltage: 1kV  (hidden comment: 33nF_C1812N_1kV_10%_X7R)
Cap Ceramic X7R; Manufacturer: Various; Part Number: 33nF C1812 1kV 10% X7R; Tol: 10%; Package: CAPC1812X190N; EDM-PN: *; Text2: *; SAAB PN: *; DCE Part No: *
footprint CAPC1812X190N (Chip Capacitor, 1812, 2-Leads, Body 4.5x3.2mm, IPC Medium Density)
pins: 1, 2

## 33nF_2220N_1kV_10%_X7R
designator C?, comment value 33nF  Text1: C2220  Voltage: 1kV  (hidden comment: 33nF_C2220N_1kV_10%_X7R)
Cap Ceramic X7R; Manufacturer: Various; Part Number: 33nF C2220 1kV 10% X7R; Tol: 10%; Package: CAPC2220x280; EDM-PN: *; Text2: *; SAAB PN: *; DCE Part No: *
footprint CAPC2220x280 (Chip Capacitor, 1825, 2-Leads, Body 5.6x5.0mm)
pins: 1, 2

## 33pF_0201N_50V_5%_C0G/NP0
designator C?, comment value 33pF  Voltage: 50V  Text1: 0201  (hidden comment: 33pF_C0201_50V_5%_C0G/NP0)
Cap Ceramic C0G/NP0; Manufacturer: Various; Part Number: 33pF 0201 50V 5%_C0G/NP0; Tol: 5%; Package: CAPC0201X33N; EDM-PN: *; Text2: *; SAAB PN: *; DCE Part No: *
footprint CAPC0201X33N (Chip Capacitor, 0201, 2-Leads, Body 0.6x0.3mm, IPC Medium Density)
pins: 1, 2

## 33pF_0402N_10V_5%_C0G/NP0
designator C?, comment value 33pF  Voltage: 10V  Text1: 0402  (hidden comment: 33pF_C0402_10V_5%_C0G/NP0)
Cap Ceramic C0G/NP0; Manufacturer: Various; Part Number: 33pF 0402 10V 5% C0G/NP0; Tol: 5%; Package: CAPC0402X60N; EDM-PN: *; Text2: *; SAAB PN: *; DCE Part No: *
footprint CAPC0402X60N (Chip Capacitor, 0402, 2-Leads, Body 1.0x0.5mm, IPC Medium Density)
pins: 1, 2

## 33pF_0402N_16V_5%_C0G/NP0
designator C?, comment value 33pF  Voltage: 16V  Text1: 0402  (hidden comment: 33pF_C0402_16V_5%_C0G/NP0)
Cap Ceramic C0G/NP0; Manufacturer: Various; Part Number: 33pF 0402 16V 5% C0G/NP0; Tol: 5%; Package: CAPC0402X60N; EDM-PN: *; Text2: *; SAAB PN: *; DCE Part No: *
footprint CAPC0402X60N (Chip Capacitor, 0402, 2-Leads, Body 1.0x0.5mm, IPC Medium Density)
pins: 1, 2

## 33pF_0402N_50V_5%_C0G/NP0
designator C?, comment value 33pF  Voltage: 50V  Text1: 0402  (hidden comment: 33pF_C0402_50V_5%_C0G/NP0)
Cap Ceramic C0G/NP0; Manufacturer: Various; Part Number: 33pF 0402 50V 5% C0G/NP0; EDM-PN: CAP324; Tol: 5%; Package: CAPC0402X60N; Text2: *; SAAB PN: *; DCE Part No: *
footprint CAPC0402X60N (Chip Capacitor, 0402, 2-Leads, Body 1.0x0.5mm, IPC Medium Density)
pins: 1, 2

## 33pF_0402N_50V_10%_C0G/NP0
designator C?, comment value 33pF  Voltage: 50V  Text1: 0402  (hidden comment: 33pF_C0402_50V_10%_C0G/NP0)
Cap Ceramic C0G/NP0; Manufacturer: Various; Part Number: 33pF 0402 50V 5% C0G/NP0; DCE Part No: 7195; Tol: 10%; Package: CAPC0402X60N; EDM-PN: *; Text2: *; SAAB PN: *
footprint CAPC0402X60N (Chip Capacitor, 0402, 2-Leads, Body 1.0x0.5mm, IPC Medium Density)
pins: 1, 2

## 33pF_0603N_25V_10%_C0G/NP0
designator C?, comment value 33pF  Voltage: 25V  Text1: 0603  (hidden comment: 33pF_C0603_25V_10%_C0G/NP0)
Cap Ceramic C0G/NP0; Manufacturer: Various; Part Number: 33pF 0603 25V 10% C0G/NP0; Tol: 10%; Package: CAPC0603X85N; EDM-PN: *; Text2: *; SAAB PN: *; DCE Part No: *
footprint CAPC0603X85N (Chip Capacitor, 0603, 2-Leads, Body 1.6x0.8mm, IPC Medium Density)
pins: 1, 2

## 33pF_0603N_50V_5%_C0G/NP0
designator C?, comment value 33pF  Voltage: 50V  Text1: 0603  (hidden comment: 33pF_C0603_50V_5%_C0G/NP0)
Cap Ceramic C0G/NP0; Manufacturer: Various; Part Number: 33pF 0603 50V 5% C0G/NP0; EDM-PN: CAP1014; Tol: 5%; Package: CAPC0603X85N; Text2: *; Reutech PN: *; SAAB PN: *; DCE Part No: *
footprint CAPC0603X85N (Chip Capacitor, 0603, 2-Leads, Body 1.6x0.8mm, IPC Medium Density)
pins: 1, 2

## 33pF_0603N_50V_10%_NP0
designator C?, comment value 33pF  Voltage: 50V  Text1: 0603  (hidden comment: 33pF_C0603_50V_10%_NP0)
Cap Ceramic NP0; Manufacturer: Various; Part Number: 33pF 0603 50V 10% NP0; Tol: 10%; Package: CAPC0603X85N; EDM-PN: *; Text2: *; SAAB PN: *; DCE Part No: *
footprint CAPC0603X85N (Chip Capacitor, 0603, 2-Leads, Body 1.6x0.8mm, IPC Medium Density)
pins: 1, 2

## 33pF_0603N_50V_10%_NP0-DNF
designator C?, comment value (33pF)  Voltage: 50V  Text1: 0603  (hidden comment: 33pF_C0603_50V_10%_NP0-DNF)
Cap Ceramic NP0 - Do not Fit; Manufacturer: Various; Part Number: DNF - 33pF 0603 50V 10% NP0; Tol: 10%; Package: CAPC0603X85N; EDM-PN: *; Text2: *; SAAB PN: *; DCE Part No: *
footprint CAPC0603X85N (Chip Capacitor, 0603, 2-Leads, Body 1.6x0.8mm, IPC Medium Density)
pins: 1, 2

## 33pF_0805N_50V_5%_C0G/NP0
designator C?, comment value 33pF  Voltage: 50V  Text1: 0805  (hidden comment: 33pF_C0805_50V_5%_C0G/NP0)
Cap Ceramic C0G/NP0; Manufacturer: Various; Part Number: 33pF 0805 50V 5% C0G/NP0; Tol: 5%; Package: CAPC0805X110N; EDM-PN: *; Text2: *; SAAB PN: *; DCE Part No: *
footprint CAPC0805X110N (Chip Capacitor, 0805, 2-Leads, Body 2.0x1.3mm, IPC Medium Density)
pins: 1, 2

## 33pF_0805N_50V_10%_X7R
designator C?, comment value 33pF  Voltage: 50V  Text1: 0805  (hidden comment: 33pF_C0805_50V_10%_X7R)
Cap Ceramic X7R; Manufacturer: Various; Part Number: 33pF 0805 50V 10% X7R; Tol: 10%; Package: CAPC0805X110N; EDM-PN: *; Text2: *; SAAB PN: *; DCE Part No: *
footprint CAPC0805X110N (Chip Capacitor, 0805, 2-Leads, Body 2.0x1.3mm, IPC Medium Density)
pins: 1, 2